# Altium footprint library PCB_CONNECTORS.PcbLib: 676 footprints (part 4 of 43)
Each footprint in its own frame and in the unit in brackets; x right, y up, seen from the top. Pads: shape width x height; smd on the part's side, far side on the other; paste and mask are expansions set on the pad; w line width, h text height; cw(c..) or ccw(c..) is an arc to the next point about the centre after c.
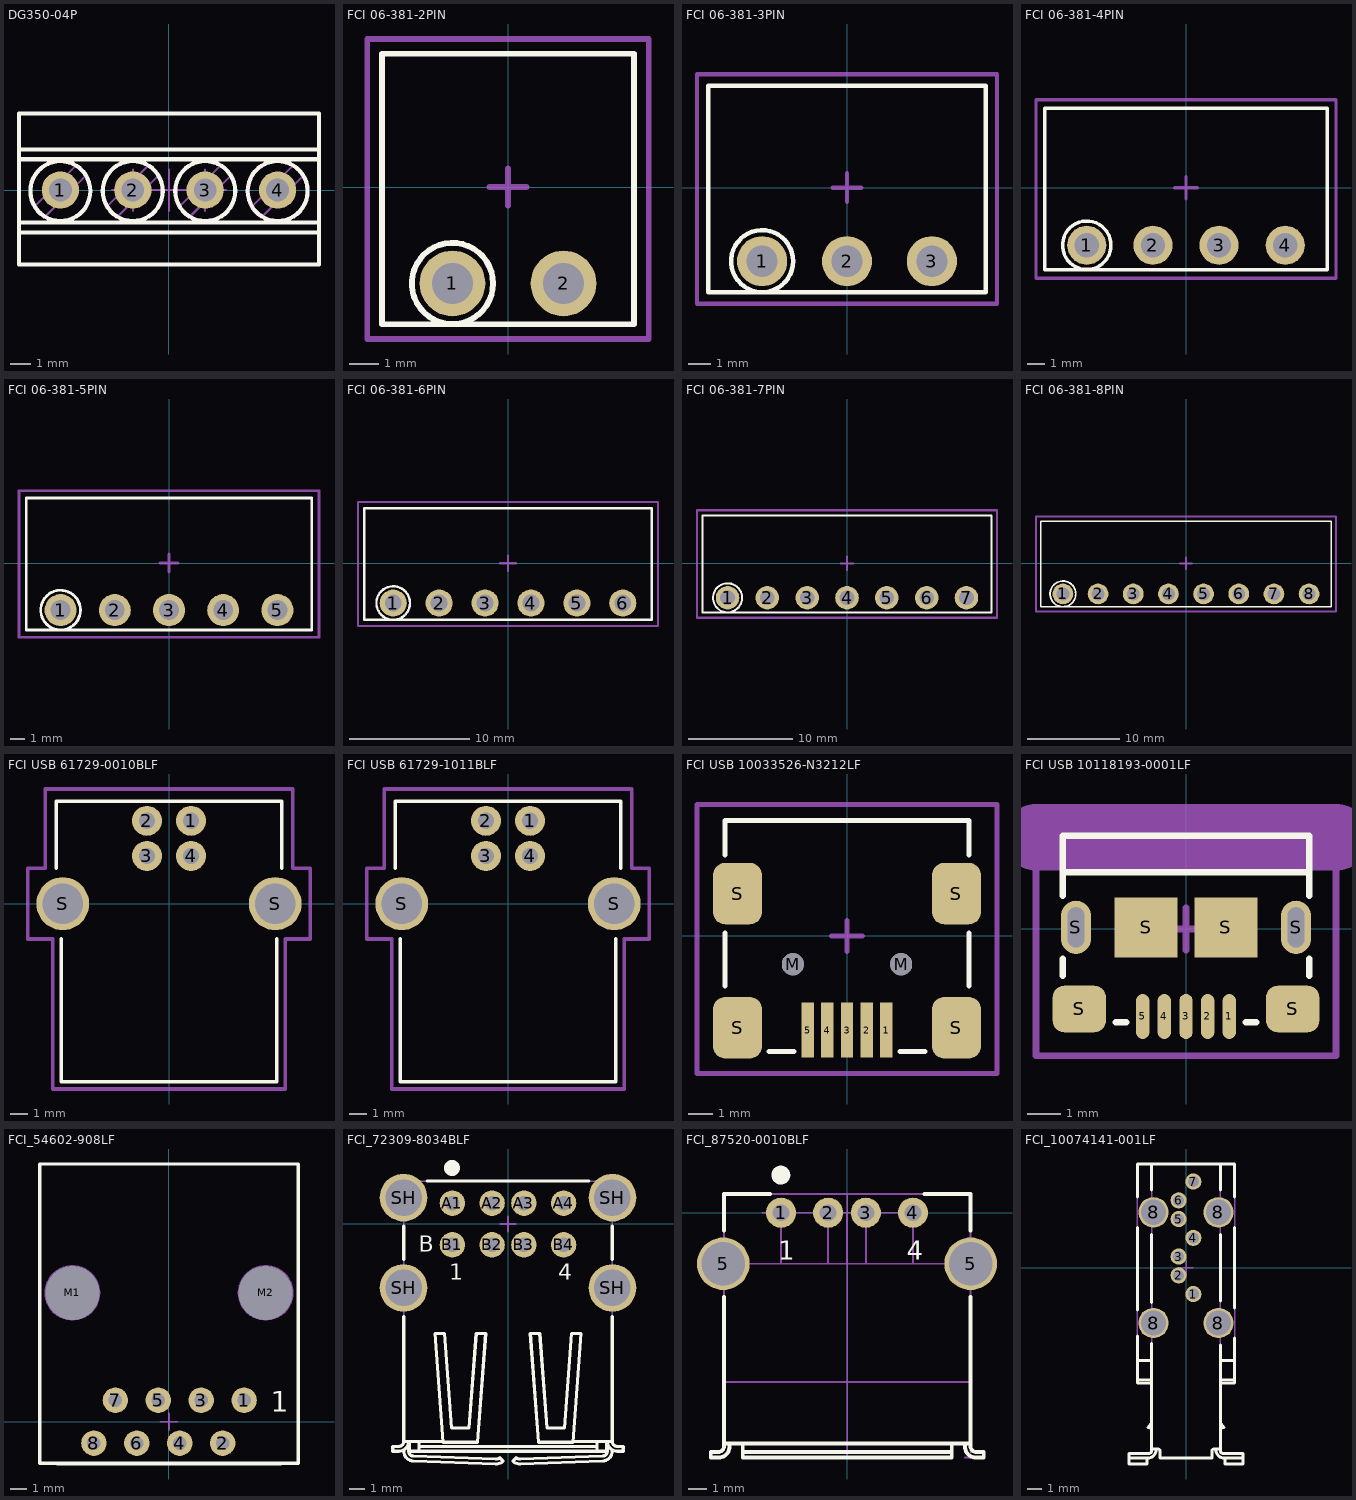
[diagram p3: the footprints below, top view; thin cyan lines are the x and y axes]

## DG350-04P [mm]
pads (4):
  round 1.8 hole 1.1: 1(-5.25,0) 2(-1.75,0) 3(1.75,0) 4(5.25,0)
Top Overlay:
  circle w0.2: c-1.75,-0.05 r1.45
  circle w0.2: c-5.25,-0.05 r1.45
  circle w0.2: c5.25,-0.05 r1.45
  circle w0.2: c1.75,-0.05 r1.45
  lines w0.2: -7.25,-2.049 0.25,-2.049 ; -7.25,-1.566 0.25,-1.566 ; -7.25,1.487 0.25,1.487 ; -7.25,1.962 0.25,1.962 ; -0.25,-3.6 7.25,-3.6 7.25,3.7 -0.25,3.7 ; -0.25,-2.049 7.25,-2.049 ; -0.25,-1.566 7.25,-1.566 ; -0.25,1.487 7.25,1.487 ; -0.25,1.962 7.25,1.962 ; 0.25,-3.6 -7.25,-3.6 -7.25,3.7 0.25,3.7
Mechanical 8:
  lines w0.1: -2.75,0 -1.75,0 ; -1.75,-1 -1.75,0 ; -1.75,1 -1.75,0 ; -1,0 0,0 ; -0.75,0 -1.75,0 ; 0,-1 0,0 ; 0,1 0,0 ; 0.75,0 1.75,0 ; 1,0 0,0 ; 1.75,-1 1.75,0 ; 1.75,1 1.75,0 ; 2.75,0 1.75,0
Mechanical 14:
  circle w0.1: c-1.75,-0.05 r1.4
  circle w0.1: c-5.25,-0.05 r1.4
  circle w0.1: c-1.75,-0.05 r1.45
  circle w0.1: c-5.25,-0.05 r1.45
  circle w0.1: c5.25,-0.05 r1.4
  circle w0.1: c1.75,-0.05 r1.4
  circle w0.1: c5.25,-0.05 r1.45
  circle w0.1: c1.75,-0.05 r1.45
  lines w0.1: -7.25,-2.049 0.25,-2.049 ; -7.25,-1.566 0.25,-1.566 ; -7.25,1.487 0.25,1.487 ; -7.25,1.962 0.25,1.962 ; -6.456,-0.761 -4.539,1.156 ; -5.961,-1.256 -4.044,0.661 ; -2.956,-0.761 -1.039,1.156 ; -2.461,-1.256 -0.544,0.661 ; -0.25,-3.6 7.25,-3.6 7.25,3.7 -0.25,3.7 ; -0.25,-2.049 7.25,-2.049 ; -0.25,-1.566 7.25,-1.566 ; -0.25,1.487 7.25,1.487 ; -0.25,1.962 7.25,1.962 ; 0.25,-3.6 -7.25,-3.6 -7.25,3.7 0.25,3.7 ; 0.544,-0.761 2.461,1.156 ; 1.039,-1.256 2.956,0.661 ; 4.044,-0.761 5.961,1.156 ; 4.539,-1.256 6.456,0.661
3D body "PHOENIX_1751248.stp": height 8.5, standoff -3.5, extent -7.25,-3.6 0.25,3.7
3D body "PHOENIX_1751248.stp": height 8.5, standoff -3.5, extent -0.25,-3.6 7.25,3.7

## FCI 06-381-2PIN [mm] "FCI Pluggable Terminal Block"
height 7
pads (2):
  round 2.25 hole 1.4: 1(-1.905,-3.302) 2(1.905,-3.302)
Top Overlay:
  circle w0.2: c-1.905,-3.302 r1.393
  lines w0.2: -4.318,-4.699 4.318,-4.699 4.318,4.572 -4.318,4.572 -4.318,-4.699
Mechanical 15:
  lines w0.2: -0.635,0 0.635,0 ; 0,-0.635 0,0.635 ; -4.826,-5.207 4.826,-5.207 4.826,5.08 -4.826,5.08 -4.826,-5.207
3D body "FCI 06-381 2Pos.STEP": height 7.6, standoff -3.52, extent -4.405,-4.699 4.405,4.501

## FCI 06-381-3PIN [mm] "FCI Pluggable Terminal Block"
height 7
pads (3):
  round 2.25 hole 1.4: 1(-3.81,-3.302) 2(0,-3.302) 3(3.81,-3.302)
Top Overlay:
  circle w0.2: c-3.81,-3.302 r1.393
  lines w0.2: -6.223,-4.699 -6.223,4.572 6.223,4.572 6.223,-4.699 -6.223,-4.699
Mechanical 15:
  lines w0.2: -0.635,0 0.635,0 ; 0,-0.635 0,0.635 ; -6.731,-5.207 -6.731,5.08 6.731,5.08 6.731,-5.207 -6.731,-5.207
3D body "FCI 06-381 3Pos.STEP": height 7.6, standoff -3.52, extent -6.31,-4.699 6.31,4.501

## FCI 06-381-4PIN [mm] "FCI Pluggable Terminal Block"
height 7
pads (4):
  round 2.25 hole 1.4: 1(-5.715,-3.302) 2(-1.905,-3.302) 3(1.905,-3.302) 4(5.715,-3.302)
Top Overlay:
  circle w0.2: c-5.715,-3.302 r1.393
  lines w0.2: -8.128,-4.699 -8.128,4.572 8.128,4.572 8.128,-4.699 -8.128,-4.699
Mechanical 15:
  lines w0.2: -0.635,0 0.635,0 ; 0,-0.635 0,0.635 ; -8.636,-5.207 -8.636,5.08 8.636,5.08 8.636,-5.207 -8.636,-5.207
3D body "FCI 06-381 4Pos.STEP": height 7.6, standoff -3.52, extent -8.215,-4.699 8.215,4.501

## FCI 06-381-5PIN [mm] "FCI Pluggable Terminal Block"
height 7
pads (5):
  round 2.25 hole 1.4: 1(-7.62,-3.302) 2(-3.81,-3.302) 3(0,-3.302) 4(3.81,-3.302) 5(7.62,-3.302)
Top Overlay:
  circle w0.2: c-7.62,-3.302 r1.393
  lines w0.2: -10.033,-4.699 10.033,-4.699 10.033,4.572 -10.033,4.572 -10.033,-4.699
Mechanical 15:
  lines w0.2: -0.635,0 0.635,0 ; 0,-0.635 0,0.635 ; -10.541,-5.207 10.541,-5.207 10.541,5.08 -10.541,5.08 -10.541,-5.207
3D body "FCI 06-381 5Pos.STEP": height 7.6, standoff -3.52, extent -10.12,-4.699 10.12,4.501

## FCI 06-381-6PIN [mm] "FCI Pluggable Terminal Block"
height 7
pads (6):
  round 2.25 hole 1.4: 1(-9.525,-3.302) 2(-5.715,-3.302) 3(-1.905,-3.302) 4(1.905,-3.302) 5(5.715,-3.302) 6(9.525,-3.302)
Top Overlay:
  circle w0.2: c-9.525,-3.302 r1.393
  lines w0.2: -11.938,-4.699 -11.938,4.572 11.938,4.572 11.938,-4.699 -11.938,-4.699
Mechanical 15:
  lines w0.2: -0.635,0 0.635,0 ; 0,-0.635 0,0.635 ; -12.446,-5.207 -12.446,5.08 12.446,5.08 12.446,-5.207 -12.446,-5.207
3D body "FCI 06-381 6Pos.STEP": height 7.6, standoff -3.52, extent -12.025,-4.699 12.025,4.501

## FCI 06-381-7PIN [mm] "FCI Pluggable Terminal Block"
height 7
pads (7):
  round 2.25 hole 1.4: 1(-11.43,-3.302) 2(-7.62,-3.302) 3(-3.81,-3.302) 4(0,-3.302) 5(3.81,-3.302) 6(7.62,-3.302) 7(11.43,-3.302)
Top Overlay:
  circle w0.2: c-11.43,-3.302 r1.393
  lines w0.2: -13.843,-4.699 -13.843,4.572 13.843,4.572 13.843,-4.699 -13.843,-4.699
Mechanical 15:
  lines w0.2: -0.635,0 0.635,0 ; 0,-0.635 0,0.635 ; -14.351,-5.207 -14.351,5.08 14.351,5.08 14.351,-5.207 -14.351,-5.207
3D body "FCI 06-381 7Pos.STEP": height 7.6, standoff -3.52, extent -13.93,-4.699 13.93,4.501

## FCI 06-381-8PIN [mm] "FCI Pluggable Terminal Block"
height 7
pads (8):
  round 2.25 hole 1.4: 1(-13.335,-3.302) 2(-9.525,-3.302) 3(-5.715,-3.302) 4(-1.905,-3.302) 5(1.905,-3.302) 6(5.715,-3.302) 7(9.525,-3.302) 8(13.335,-3.302)
Top Overlay:
  circle w0.2: c-13.335,-3.302 r1.393
  lines w0.2: -15.748,-4.699 -15.748,4.572 15.748,4.572 15.748,-4.699 -15.748,-4.699
Mechanical 15:
  lines w0.2: -0.635,0 0.635,0 ; 0,-0.635 0,0.635 ; -16.256,-5.207 -16.256,5.08 16.256,5.08 16.256,-5.207 -16.256,-5.207
3D body "FCI 06-381 8Pos.STEP": height 7.6, standoff -3.52, extent -15.835,-4.699 15.835,4.501

## FCI USB 61729-0010BLF [mm]
height 11
pads (6):
  round 1.7 hole 0.92: 1(1.25,4.7) 2(-1.25,4.7) 3(-1.25,2.71) 4(1.25,2.71)
  round 3 hole 2.3: S(-6.02,0) S(6.02,0)
Top Overlay:
  lines w0.2: -6.4,2 -6.4,5.8 6.4,5.8 6.4,2 ; -6.1,-2 -6.1,-10.1 6.1,-10.1 6.1,-2
Mechanical 15:
  lines w0.2: -8,-2 -6.6,-2 -6.6,-10.5 0,-10.5 6.6,-10.5 6.6,-2 8,-2 8,2 7,2 7,6.5 0,6.5 -7,6.5 -7,2 -8,2 -8,-2
3D body "FCI 61729-0010BLF.STEP": height 11, standoff -2.8, extent -6.56,-10.175 6.56,5.765

## FCI USB 61729-1011BLF [mm]
height 11
pads (6):
  round 1.7 hole 0.92: 1(1.25,4.7) 2(-1.25,4.7) 3(-1.25,2.71) 4(1.25,2.71)
  round 3 hole 2.3: S(-6.02,0) S(6.02,0)
Top Overlay:
  lines w0.2: -6.4,2 -6.4,5.8 6.4,5.8 6.4,2 ; -6.1,-2 -6.1,-10.1 6.1,-10.1 6.1,-2
Mechanical 15:
  lines w0.2: -8,-2 -8,2 -7,2 -7,6.5 0,6.5 7,6.5 7,2 8,2 8,-2 6.6,-2 6.6,-10.5 0,-10.5 -6.6,-10.5 -6.6,-2 -8,-2
3D body "FCI 61729-1011BLF.STEP": height 11, standoff -2.8, extent -6.56,-10.175 6.56,5.765

## FCI USB 10033526-N3212LF [mm] "USB 2.0 Type B Mini"
height 3.95
pads (11):
  rect 0.5x2.25 smd: 1(1.6,-3.826) 2(0.8,-3.826) 3(0,-3.826) 4(-0.8,-3.826) 5(-1.6,-3.826)
  round 0.9 hole 0.9 unplated: M(-2.2,-1.151) M(2.2,-1.151)
  rrect50% 2x2.5 smd: S(-4.45,-3.731) S(-4.45,1.719) S(4.45,-3.731) S(4.45,1.719)
Top Overlay:
  lines w0.2: -4.953,-2.04 -4.953,0.119 ; -4.953,3.294 -4.953,4.691 4.953,4.691 4.953,3.294 ; -3.175,-4.707 -2.159,-4.707 ; 2.159,-4.707 3.175,-4.707 ; 4.953,-2.04 4.953,0.119
Mechanical 15:
  lines w0.2: -0.635,0 0.635,0 ; 0,-0.635 0,0.635 ; -6.096,-5.588 -6.096,5.334 6.096,5.334 6.096,-5.588 -6.096,-5.588
3D body "FCI USB 10033526-N3212LF.STEP": height 4.01, standoff -0.99, extent -4.95,-4.701 4.95,4.699

## FCI USB 10118193-0001LF [mm] "USB 2.0 Type B Micro"
height 3.1
pads (11):
  oval 0.4x1.35 smd: 1(1.3,-2.625) 2(0.65,-2.625) 3(0,-2.625) 4(-0.65,-2.625) 5(-1.3,-2.625)
  oval 0.9x1.6 hole 0.5 slot 1.2 at 90 deg: S(-3.3,0.05) S(3.3,0.05)
  rrect50% 1.6x1.4 smd: S(-3.2,-2.4) S(3.2,-2.4)
  rect 1.9x1.8 smd: S(-1.2,0.05) S(1.2,0.05)
Top Overlay:
  lines w0.2: -3.7,-1.4 -3.7,-0.9 ; -3.7,1 -3.7,1.7 ; -2.1,-2.8 -1.8,-2.8 ; 1.8,-2.8 2.1,-2.8 ; 3.7,-1.4 3.7,-0.9 ; 3.7,1 3.7,1.7 ; -3.7,1.7 -3.7,2.8 3.7,2.8 3.7,1.7 ; -3.7,1.7 3.7,1.7
Mechanical 15:
  lines w0.2: -0.635,0 0.635,0 ; 0,-0.635 0,0.635 ; -4.5,-3.8 4.5,-3.8 4.5,3.2 -4.5,3.2 -4.5,-3.8
Mechanical 31:
  lines w2: -4.5,2.754 0,2.754 4.5,2.754
3D body "FCI USB 10118193-0001lfc.STEP": height 2.78, standoff -0.82, extent -3.929,-2.9 3.928,2.76

## FCI_54602-908LF [mm] "1 Port, 8 Positions, CAT3 RJ45 Horizontal Modular Jack"
height 10
pads (10):
  round 1.5 hole 0.8: 1(4.445,1.27) 2(3.175,-1.27) 3(1.905,1.27) 4(0.635,-1.27) 5(-0.635,1.27) 6(-1.905,-1.27) 7(-3.171,1.27) 8(-4.445,-1.27)
  round 1 hole 3.2 unplated mask+1.1: M1(-5.715,7.62) M2(5.715,7.62)
Top Overlay:
  lines w0.2: -6.6,-2.46 -6.6,-2.5 6.6,-2.5 6.6,-2.46 ; -7.65,-2.46 7.65,-2.46 7.65,15.24 -7.65,15.24 -7.65,-2.46
  text "1" at 6.03,0.6 h1.2
Mechanical 8:
  circle w0.1: c5.715,7.62 r1.6
  circle w0.1: c-5.715,7.62 r1.6
  circle w0.1: c4.445,1.27 r0.415
  circle w0.1: c-3.175,1.27 r0.415
  circle w0.1: c-4.445,-1.27 r0.415
  circle w0.1: c3.175,-1.27 r0.415
  lines w0.1: -6.215,7.62 -5.715,7.62 ; -5.715,7.12 -5.715,7.62 ; -5.715,8.12 -5.715,7.62 ; -5.215,7.62 -5.715,7.62 ; -4.945,-1.27 -4.445,-1.27 ; -4.445,-1.77 -4.445,-1.27 ; -4.445,-0.77 -4.445,-1.27 ; -3.945,-1.27 -4.445,-1.27 ; -3.675,1.27 -3.175,1.27 ; -3.175,0.77 -3.175,1.27 ; -3.175,1.77 -3.175,1.27 ; -2.675,1.27 -3.175,1.27 ; -2.405,-1.27 -1.905,-1.27 ; -1.905,-1.77 -1.905,-1.27 ; -1.905,-0.77 -1.905,-1.27 ; -1.405,-1.27 -1.905,-1.27 ; -1.135,1.27 -0.635,1.27 ; -0.635,0.77 -0.635,1.27 ; -0.635,1.77 -0.635,1.27 ; -0.5,0 0,0 ; -0.135,1.27 -0.635,1.27 ; 0,-0.5 0,0 ; 0,0.5 0,0 ; 0.135,-1.27 0.635,-1.27 ; 0.5,0 0,0 ; 0.635,-1.77 0.635,-1.27 ; 0.635,-0.77 0.635,-1.27 ; 1.135,-1.27 0.635,-1.27 ; 1.405,1.27 1.905,1.27 ; 1.905,0.77 1.905,1.27 ; 1.905,1.77 1.905,1.27 ; 2.405,1.27 1.905,1.27 ; 2.675,-1.27 3.175,-1.27 ; 3.175,-1.77 3.175,-1.27 ; 3.175,-0.77 3.175,-1.27 ; 3.675,-1.27 3.175,-1.27 ; 3.945,1.27 4.445,1.27 ; 4.445,0.77 4.445,1.27 ; 4.445,1.77 4.445,1.27 ; 4.945,1.27 4.445,1.27 ; 5.215,7.62 5.715,7.62 ; 5.715,7.12 5.715,7.62 ; 5.715,8.12 5.715,7.62 ; 6.215,7.62 5.715,7.62
Mechanical 14:
  lines w0.1: -6.6,-2.46 -6.6,-2.5 6.6,-2.5 6.6,-2.46 ; -7.65,-2.46 7.65,-2.46 7.65,15.24 -7.65,15.24 -7.65,-2.46
  text "1" at 6.03,0.6 h1.2
3D body "FCI_54602-908LF.stp": height 12.7, standoff -3.5, extent -7.65,-2.5 7.65,15.24

## FCI_72309-8034BLF [mm] "Dual USB Type A 4 Pin Receptacle, Right Angle, Shielded"
height 15.5
pads (12):
  round 1.6 hole 0.9: A1(-3.5,1.31) A2(-1,1.31) A3(1,1.31) A4(3.5,1.31) B1(-3.5,-1.31) B2(-1,-1.31) B3(1,-1.31) B4(3.5,-1.31)
  round 3 hole 2.3: SH(-6.57,-4.02) SH(-6.57,1.66) SH(6.57,-4.02) SH(6.57,1.66)
Top Overlay:
  circle w0.5: c-3.525,3.525 r0.25
  lines w0.2: -6.555,-14.214 -6.555,-14.3 ccw(c-5.95,-14.3) -5.973,-14.905 -0.78,-15.1 ccw(c-0.755,-14.433) -0.305,-14.925 -0.511,-14.7 cw(c-0.755,-14.433) -0.769,-14.795 -5.961,-14.6 cw(c-5.95,-14.3) -6.25,-14.3 -6.25,-13.68 cw(c-6.87,-13.68) -6.87,-14.3 -7.25,-14.301 -7.25,-13.995 -6.87,-13.995 ccw(c-6.87,-13.68) -6.555,-13.68 ; -6.555,-5.82 -6.555,-13.68 ; -6.555,-2.22 -6.555,-0.14 ; -6.2,-13.68 -6.2,-14.3 6.2,-14.3 6.2,-13.68 ; -5.6,-14.3 -5.6,-13.68 ; -5.6,-13.995 5.6,-13.995 ; -5.102,2.701 5.086,2.7 ; -4.094,-13.68 -6.555,-13.68 ; -4.085,-13.724 -4.602,-6.88 -4,-6.88 -3.55,-12.84 -2.45,-12.84 -2,-6.88 -1.398,-6.88 -1.915,-13.73 -4.085,-13.73 ; 0.755,-14.795 5.961,-14.6 ccw(c5.95,-14.3) 6.25,-14.3 6.25,-13.68 ccw(c6.87,-13.68) 6.87,-14.3 7.25,-14.3 7.25,-13.995 6.87,-13.995 cw(c6.87,-13.68) 6.555,-13.68 ; 0.769,-14.795 cw(c0.755,-14.433) 0.511,-14.7 0.305,-14.925 ccw(c0.755,-14.433) 0.78,-15.1 5.973,-14.905 ccw(c5.95,-14.3) 6.555,-14.3 6.555,-14.214 ; 1.915,-13.73 4.085,-13.73 4.602,-6.88 4,-6.88 3.55,-12.84 2.45,-12.84 2,-6.88 1.398,-6.88 1.915,-13.724 ; 4.088,-13.68 6.555,-13.68 ; 5.6,-14.3 5.6,-13.68 ; 6.555,-5.82 6.555,-13.68 ; 6.555,-2.22 6.555,-0.14
  text "4" at 3.148,-3.5 h1
  text "1" at -3.685,-3.5 h1
  text "B" at -5.613,-1.75 h1
Mechanical 8:
  lines w0.1: -7.07,-4.02 -6.57,-4.02 ; -7.07,1.66 -6.57,1.66 ; -6.57,-4.52 -6.57,-4.02 ; -6.57,-3.52 -6.57,-4.02 ; -6.57,1.16 -6.57,1.66 ; -6.57,2.16 -6.57,1.66 ; -6.07,-4.02 -6.57,-4.02 ; -6.07,1.66 -6.57,1.66 ; -4,-1.31 -3.5,-1.31 ; -4,1.31 -3.5,1.31 ; -3.5,-1.81 -3.5,-1.31 ; -3.5,-0.81 -3.5,-1.31 ; -3.5,0.81 -3.5,1.31 ; -3.5,1.81 -3.5,1.31 ; -3,-1.31 -3.5,-1.31 ; -3,1.31 -3.5,1.31 ; -1.5,-1.31 -1,-1.31 ; -1.5,1.31 -1,1.31 ; -1,-1.81 -1,-1.31 ; -1,-0.81 -1,-1.31 ; -1,0.81 -1,1.31 ; -1,1.81 -1,1.31 ; -0.5,-1.31 -1,-1.31 ; -0.5,0 0,0 ; -0.5,1.31 -1,1.31 ; 0,-0.5 0,0 ; 0,0.5 0,0 ; 0.5,-1.31 1,-1.31 ; 0.5,0 0,0 ; 0.5,1.31 1,1.31 ; 1,-1.81 1,-1.31 ; 1,-0.81 1,-1.31 ; 1,0.81 1,1.31 ; 1,1.81 1,1.31 ; 1.5,-1.31 1,-1.31 ; 1.5,1.31 1,1.31 ; 3,-1.31 3.5,-1.31 ; 3,1.31 3.5,1.31 ; 3.5,-1.81 3.5,-1.31 ; 3.5,-0.81 3.5,-1.31 ; 3.5,0.81 3.5,1.31 ; 3.5,1.81 3.5,1.31 ; 4,-1.31 3.5,-1.31 ; 4,1.31 3.5,1.31 ; 6.07,-4.02 6.57,-4.02 ; 6.07,1.66 6.57,1.66 ; 6.57,-4.52 6.57,-4.02 ; 6.57,-3.52 6.57,-4.02 ; 6.57,1.16 6.57,1.66 ; 6.57,2.16 6.57,1.66 ; 7.07,-4.02 6.57,-4.02 ; 7.07,1.66 6.57,1.66
Mechanical 14:
  lines w0.1: -6.555,-14.214 -6.555,-14.3 ccw(c-5.95,-14.3) -5.973,-14.905 -0.78,-15.1 ccw(c-0.755,-14.433) -0.305,-14.925 -0.511,-14.7 cw(c-0.755,-14.433) -0.769,-14.795 -5.961,-14.6 cw(c-5.95,-14.3) -6.25,-14.3 -6.25,-13.68 cw(c-6.87,-13.68) -6.87,-14.3 -7.25,-14.301 -7.25,-13.995 -6.87,-13.995 ccw(c-6.87,-13.68) -6.555,-13.68 ; -6.555,1 -7.5,1 -7.5,2 -6.555,2 ; -6.555,2.701 6.555,2.7 ; -6.25,2.7 -6.25,2.918 -6.555,2.918 -6.555,-13.68 ; -6.2,-13.68 -6.2,-14.3 6.2,-14.3 6.2,-13.68 ; -5.6,-14.3 -5.6,-13.68 ; -5.6,-13.995 5.6,-13.995 ; -4.094,-13.68 -6.555,-13.68 ; -4.085,-13.724 -4.602,-6.88 -4,-6.88 -3.55,-12.84 -2.45,-12.84 -2,-6.88 -1.398,-6.88 -1.915,-13.73 -4.085,-13.73 ; 0.755,-14.795 5.961,-14.6 ccw(c5.95,-14.3) 6.25,-14.3 6.25,-13.68 ccw(c6.87,-13.68) 6.87,-14.3 7.25,-14.3 7.25,-13.995 6.87,-13.995 cw(c6.87,-13.68) 6.555,-13.68 ; 0.769,-14.795 cw(c0.755,-14.433) 0.511,-14.7 0.305,-14.925 ccw(c0.755,-14.433) 0.78,-15.1 5.973,-14.905 ccw(c5.95,-14.3) 6.555,-14.3 6.555,-14.214 ; 1.915,-13.73 4.085,-13.73 4.602,-6.88 4,-6.88 3.55,-12.84 2.45,-12.84 2,-6.88 1.398,-6.88 1.915,-13.724 ; 4.088,-13.68 6.555,-13.68 ; 5.6,-14.3 5.6,-13.68 ; 6.25,2.7 6.25,2.918 6.555,2.918 6.555,-13.68 ; 6.555,1 7.5,1 7.5,2 6.555,2
  text "4" at 3.148,-3.5 h1
  text "1" at -3.685,-3.5 h1
  text "B" at -5.613,-1.75 h1
3D body "FCI_72309-8034BLF.stp": height 16.19, standoff -2.8, extent -7.5,-15.099 7.5,2.918

## FCI_87520-0010BLF [mm] "USB 2.0 Type A Receptacle, 4 Pins, Right Angle, Shielded"
height 7.7
pads (6):
  round 1.6 hole 0.9: 1(-3.5,0) 2(-1,0) 3(1,0) 4(3.5,0)
  round 2.8 hole 2.3: 5(-6.57,-2.71) 5(6.57,-2.71)
Top Overlay:
  circle w0.5: c-3.515,2 r0.25
  lines w0.2: -6.537,-12.26 6.563,-12.26 ; -6.537,-4.46 -6.537,-12.41 cw(c-6.837,-12.41) -6.837,-12.71 -7.237,-12.71 -7.237,-13.01 -6.837,-13.01 ccw(c-6.837,-12.41) -6.237,-12.41 -6.237,-12.26 ; -6.537,-0.96 -6.537,0.99 -4.075,0.99 ; -5.537,-12.71 5.563,-12.71 ; -5.537,-12.26 -5.537,-13.01 5.563,-13.01 5.563,-12.26 ; 4.101,0.99 6.563,0.99 6.563,-0.96 ; 6.263,-12.26 6.263,-12.41 ccw(c6.863,-12.41) 6.863,-13.01 7.263,-13.01 7.263,-12.71 6.863,-12.71 cw(c6.863,-12.41) 6.563,-12.41 6.563,-4.46
  text "4" at 3.173,-2.5 h1
  text "1" at -3.66,-2.5 h1
Mechanical 8:
  circle w0.1: c-6.57,-2.71 r1.15
  circle w0.1: c-1.013,0 r0.5
  circle w0.1: c1,0 r0.5
  circle w0.1: c-3.5,0 r0.5
  circle w0.1: c3.487,0 r0.5
  circle w0.1: c6.57,-2.71 r1.15
  lines w0.1: -7.57,-2.71 -6.57,-2.71 ; -6.57,-3.71 -6.57,-2.71 ; -6.537,-9 6.563,-9 ; -4.5,0 -3.5,0 ; -3.5,-2.71 -3.5,0 ; -3.5,-1 -3.5,0 ; -2,0 -1,0 ; -1,-2.71 -1,0 ; -1,-1 -1,0 ; 0,-2.71 0,0 ; 0.013,-13.01 0.013,0.99 ; 0.013,0 1.013,0 1.013,-1 ; 1,-2.71 1,0 ; 2.5,0 3.5,0 ; 3.5,-2.71 3.5,0 ; 3.5,-1 3.5,0 ; 5.57,-2.71 6.57,-2.71 ; 6.263,-13.01 7.263,-13.01 ; 6.563,-12.71 7.263,-12.71 ; 6.57,-3.71 6.57,-2.71 ; -6.57,-2.71 6.57,-2.71 ; -3.5,0 3.5,0 ; -3.713,-0.15 -3.313,-0.15 -3.313,0.15 -3.713,0.15 -3.713,-0.15 ; -1.213,-0.15 -0.813,-0.15 -0.813,0.15 -1.213,0.15 -1.213,-0.15 ; 0.8,-0.15 1.2,-0.15 1.2,0.15 0.8,0.15 0.8,-0.15 ; 3.287,-0.15 3.687,-0.15 3.687,0.15 3.287,0.15 3.287,-0.15
Mechanical 14:
  lines w0.1: -6.537,-12.26 6.563,-12.26 ; -6.237,-12.26 -6.237,-12.41 cw(c-6.837,-12.41) -6.837,-13.01 -7.237,-13.01 -7.237,-12.71 -6.837,-12.71 ccw(c-6.837,-12.41) -6.537,-12.41 -6.537,0.99 6.563,0.99 6.563,-12.41 ccw(c6.863,-12.41) 6.863,-12.71 7.263,-12.71 7.263,-13.01 6.863,-13.01 cw(c6.863,-12.41) 6.263,-12.41 6.263,-12.26 ; -5.537,-12.71 5.563,-12.71 ; -5.537,-12.26 -5.537,-13.01 5.563,-13.01 5.563,-12.26
  text "4" at 3.173,-2.5 h1
  text "1" at -3.66,-2.5 h1
3D body "FCI_87520-0010BLF.stp": height 7.55, standoff -3.3, extent -7.9,-13.05 7.9,1.11

## FCI_10074141-001LF [mm] "1.27mm (.050\") Pitch, eSATA Right-Angle, Upright Plug, Through-Hole Solder"
height 19.6
pads (11):
  round 1.1 hole 0.75: 1(0.5,-1.79) 2(-0.5,-0.52) 3(-0.5,0.75) 4(0.5,2.02) 5(-0.5,3.29) 6(-0.5,4.56) 7(0.5,5.83)
  round 2.05 hole 1.7: 8(-2.2,-3.75) 8(-2.2,3.75) 8(2.2,-3.75) 8(2.2,3.75)
Top Overlay:
  lines w0.2: -3.853,-12.9 -2.493,-12.9 ccw(c-2.619,-12.321) -2.04,-12.447 -2.04,-12.287 ; -3.293,-7.8 -3.293,-4.624 ; -3.293,-7.593 -2.333,-7.593 ; -3.293,-6.287 -2.333,-6.287 ; -3.293,-2.876 -3.293,2.723 ; -3.293,4.777 -3.293,7.02 3.293,7.02 3.293,4.777 ; -2.653,-12.9 -2.653,-13.3 -3.853,-13.3 -3.853,-12.58 -2.493,-12.58 ccw(c-2.493,-12.42) -2.333,-12.42 -2.333,-5.144 ; -2.333,-12.287 -1.907,-12.287 cw(c-1.907,-12.447) -1.747,-12.447 ; -2.333,-10.927 -2.561,-10.813 -2.333,-10.5 ; -2.333,-2.356 -2.333,2.256 ; -2.333,5.244 -2.333,7.02 ; -1.747,-12.447 -1.747,-12.9 1.747,-12.9 1.747,-12.447 ; 1.747,-12.447 cw(c1.907,-12.447) 1.907,-12.287 2.333,-12.287 ; 2.04,-12.287 2.04,-12.447 ccw(c2.619,-12.321) 2.493,-12.9 3.853,-12.9 ; 2.333,-10.927 2.561,-10.813 2.333,-10.5 ; 2.333,-7.593 3.293,-7.593 ; 2.333,-6.287 3.293,-6.287 ; 2.333,-5.244 2.333,-12.42 ccw(c2.493,-12.42) 2.493,-12.58 3.853,-12.58 3.853,-13.3 2.653,-13.3 2.653,-12.9 ; 2.333,-2.256 2.333,2.256 ; 2.333,5.244 2.333,7.02 ; 3.293,-7.8 3.293,-4.777 ; 3.293,-2.723 3.293,2.723 ; -3.293,-7.807 -2.333,-7.807 -3.293,-7.807 ; 2.333,-7.807 3.293,-7.807 2.333,-7.807
Mechanical 8:
  lines w0.1: -2.7,-3.75 -2.2,-3.75 ; -2.7,3.75 -2.2,3.75 ; -2.2,-4.25 -2.2,-3.75 ; -2.2,-3.25 -2.2,-3.75 ; -2.2,3.25 -2.2,3.75 ; -2.2,4.25 -2.2,3.75 ; -1.7,-3.75 -2.2,-3.75 ; -1.7,3.75 -2.2,3.75 ; -1,-0.52 -0.5,-0.52 -0.5,-1.02 ; -1,0.75 -0.5,0.75 -0.5,1.25 ; -1,3.29 -0.5,3.29 -0.5,3.79 ; -1,4.56 -0.5,4.56 -0.5,5.06 ; -0.5,0 0,0 ; 0,-0.5 0,0 ; 0,0.5 0,0 ; 0,5.83 0.5,5.83 0.5,6.33 ; 0.5,-2.29 0.5,-1.79 1,-1.79 ; 0.5,0 0,0 ; 0.5,1.52 0.5,2.02 1,2.02 ; 1.7,-3.75 2.2,-3.75 ; 1.7,3.75 2.2,3.75 ; 2.2,-4.25 2.2,-3.75 ; 2.2,-3.25 2.2,-3.75 ; 2.2,3.25 2.2,3.75 ; 2.2,4.25 2.2,3.75 ; 2.7,-3.75 2.2,-3.75 ; 2.7,3.75 2.2,3.75
Mechanical 14:
  lines w0.1: -3.853,-12.9 -2.493,-12.9 ccw(c-2.619,-12.321) -2.04,-12.447 -2.04,-12.287 ; -3.293,-7.807 -2.333,-7.807 ; -3.293,-7.8 -3.293,7.02 3.293,7.02 3.293,-7.8 ; -3.293,-7.593 -2.333,-7.593 ; -3.293,-6.287 -2.333,-6.287 ; -2.653,-12.9 -2.653,-13.3 -3.853,-13.3 -3.853,-12.58 -2.493,-12.58 ccw(c-2.493,-12.42) -2.333,-12.42 -2.333,7.02 ; -2.333,-12.287 -1.907,-12.287 cw(c-1.907,-12.447) -1.747,-12.447 ; -2.333,-10.927 -2.561,-10.813 -2.333,-10.5 ; -1.747,-12.447 -1.747,-12.9 1.747,-12.9 1.747,-12.447 ; 1.747,-12.447 cw(c1.907,-12.447) 1.907,-12.287 2.333,-12.287 ; 2.04,-12.287 2.04,-12.447 ccw(c2.619,-12.321) 2.493,-12.9 3.853,-12.9 ; 2.333,-10.927 2.561,-10.813 2.333,-10.5 ; 2.333,-7.807 3.293,-7.807 ; 2.333,-7.593 3.293,-7.593 ; 2.333,-6.287 3.293,-6.287 ; 2.333,7.02 2.333,-12.42 ccw(c2.493,-12.42) 2.493,-12.58 3.853,-12.58 3.853,-13.3 2.653,-13.3 2.653,-12.9
3D body "FCI_10074141-001LF.stp": height 19.15, standoff -2.91, extent -3.85,-13.25 3.85,7.02